# Altium footprint library EwgMicrochips.PcbLib: 61 footprints (part 2 of 4)
Each footprint in its own frame and in the unit in brackets; x right, y up, seen from the top. Pads: shape width x height; smd on the part's side, far side on the other; paste and mask are expansions set on the pad; w line width, h text height; cw(c..) or ccw(c..) is an arc to the next point about the centre after c.
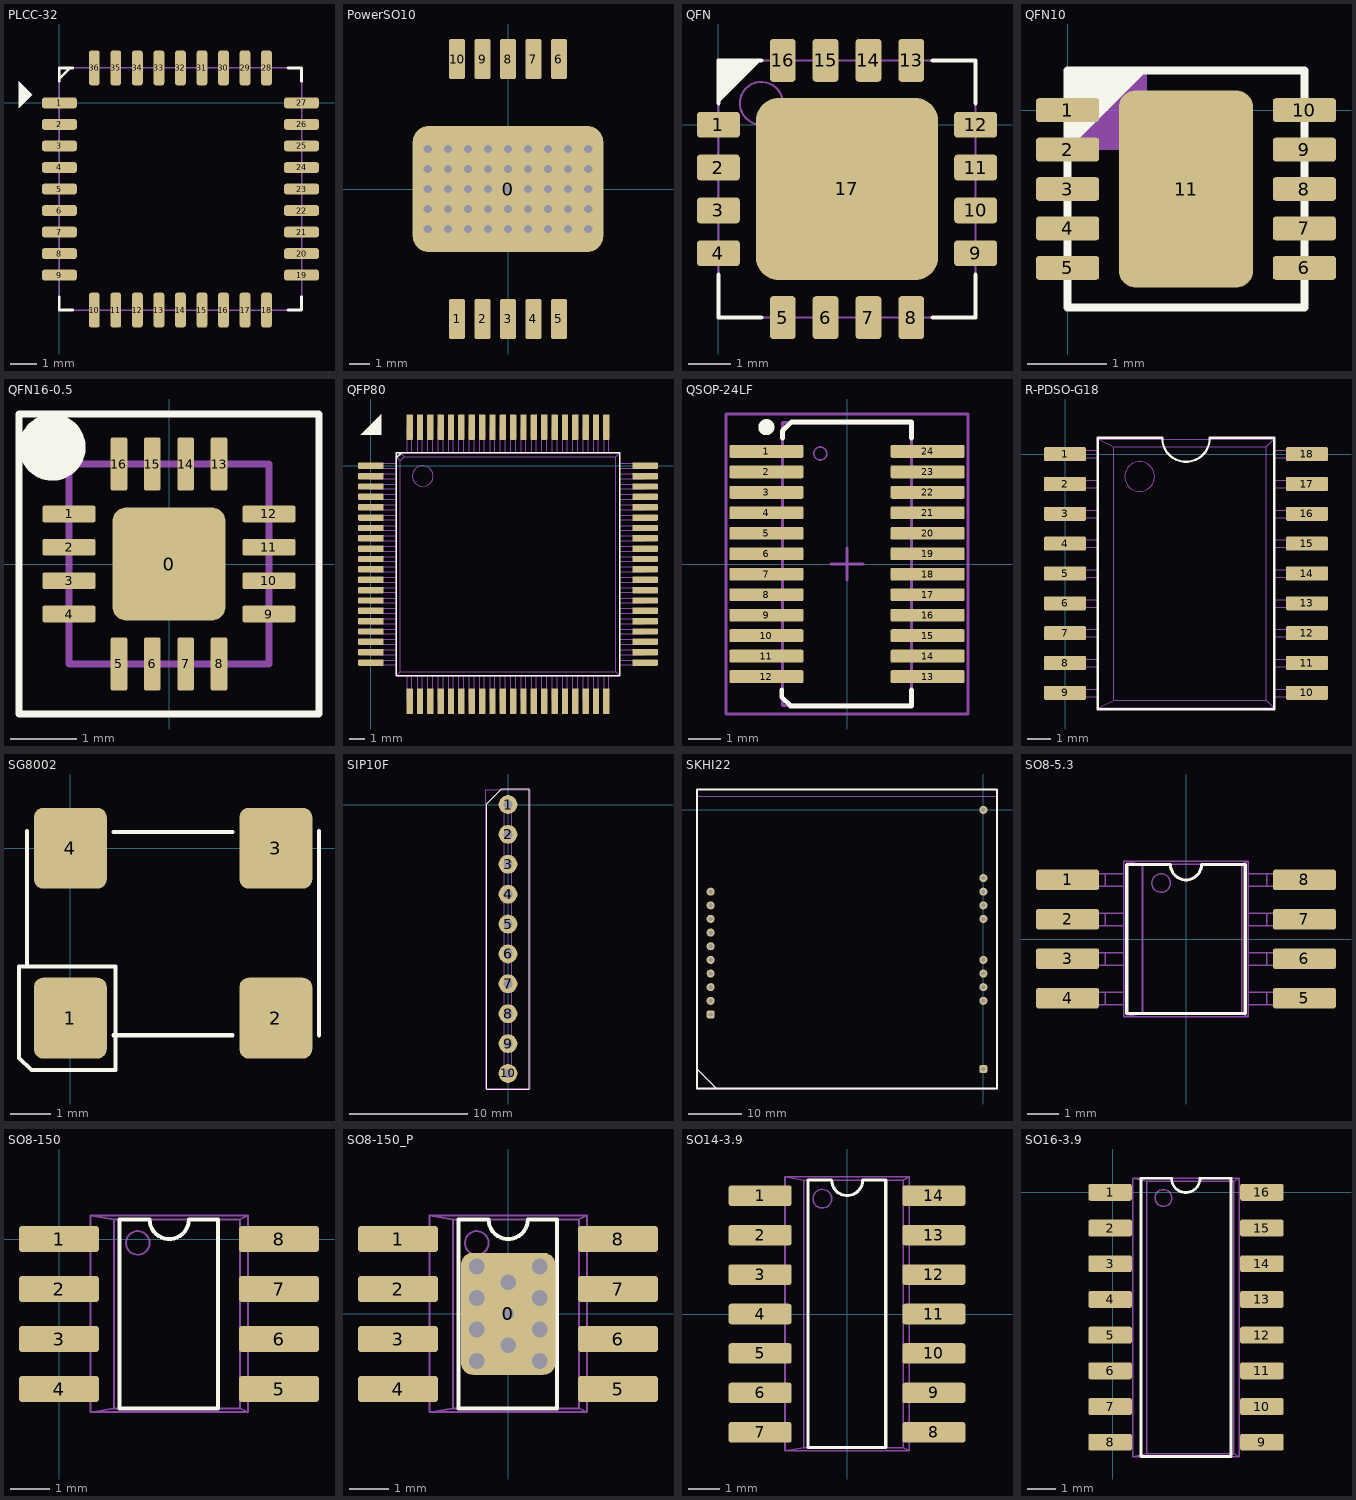
[diagram p1: the footprints below, top view; thin cyan lines are the x and y axes]

## PLCC-32 [mm]
pads (36):
  rrect50% 1.3x0.4 smd: 1(0,0) 2(0,-0.8) 3(0,-1.6) 4(0,-2.4) 5(0,-3.2) 6(0,-4) 7(0,-4.8) 8(0,-5.6) 9(0,-6.4) 19(9,-6.4) 20(9,-5.6) 21(9,-4.8) 22(9,-4) 23(9,-3.2) 24(9,-2.4) 25(9,-1.6) 26(9,-0.8) 27(9,0)
  rrect50% 0.4x1.3 smd: 10(1.3,-7.7) 11(2.1,-7.7) 12(2.9,-7.7) 13(3.7,-7.7) 14(4.5,-7.7) 15(5.3,-7.7) 16(6.1,-7.7) 17(6.9,-7.7) 18(7.7,-7.7) 28(7.7,1.3) 29(6.9,1.3) 30(6.1,1.3) 31(5.3,1.3) 32(4.5,1.3) 33(3.7,1.3) 34(2.9,1.3) 35(2.1,1.3) 36(1.3,1.3)
Top Overlay:
  region: -1.5,0.8 -1.5,-0.2 -1,0.3
  lines w0.1: 0,-7.2 0,-7.7 0.5,-7.7 ; 0,0.8 0,1.3 0.5,1.3 ; 0,0.9 0.4,1.3 ; 8.5,-7.7 9,-7.7 9,-7.2 ; 8.5,1.3 9,1.3 9,0.8
Mechanical 1:
  lines w0.05: 0,-7.7 9,-7.7 9,1.3 0,1.3 0,-7.7
  text "PLCC - 32" at 2,-4.425 h0.63
  text "HMC6343" at 2,-3.062 h0.63

## PowerSO10 [mm]
pads (11):
  rrect25% 9.5x6.3 all layers, no hole: 0(0,0)
  rrect25% 0.8x2 smd: 1(-2.54,-6.477) 2(-1.27,-6.477) 3(0,-6.477) 4(1.27,-6.477) 5(2.54,-6.477) 6(2.54,6.477) 7(1.27,6.477) 8(0,6.477) 9(-1.27,6.477) 10(-2.54,6.477)
via 4,2 diameter 0.6 hole 0.4
via 4,0 diameter 0.6 hole 0.4
via 4,1 diameter 0.6 hole 0.4
via 4,-1 diameter 0.6 hole 0.4
via 4,-2 diameter 0.6 hole 0.4
via 3,-2 diameter 0.6 hole 0.4
via 3,-1 diameter 0.6 hole 0.4
via 3,1 diameter 0.6 hole 0.4
via 3,0 diameter 0.6 hole 0.4
via 3,2 diameter 0.6 hole 0.4
via 2,-1 diameter 0.6 hole 0.4
via 2,-2 diameter 0.6 hole 0.4
via 2,0 diameter 0.6 hole 0.4
via 2,1 diameter 0.6 hole 0.4
via 2,2 diameter 0.6 hole 0.4
via 1,1 diameter 0.6 hole 0.4
via 1,2 diameter 0.6 hole 0.4
via 1,0 diameter 0.6 hole 0.4
via 1,-2 diameter 0.6 hole 0.4
via 1,-1 diameter 0.6 hole 0.4
via 0,-1 diameter 0.6 hole 0.4
via 0,-2 diameter 0.6 hole 0.4
via -1,-1 diameter 0.6 hole 0.4
via 0,1 diameter 0.6 hole 0.4
via 0,2 diameter 0.6 hole 0.4
via -1,2 diameter 0.6 hole 0.4
via -1,1 diameter 0.6 hole 0.4
via -1,0 diameter 0.6 hole 0.4
via -1,-2 diameter 0.6 hole 0.4
via -2,-2 diameter 0.6 hole 0.4
via -2,-1 diameter 0.6 hole 0.4
via -2,0 diameter 0.6 hole 0.4
via -2,1 diameter 0.6 hole 0.4
via -2,2 diameter 0.6 hole 0.4
via -3,2 diameter 0.6 hole 0.4
via -3,1 diameter 0.6 hole 0.4
via -3,0 diameter 0.6 hole 0.4
via -3,-1 diameter 0.6 hole 0.4
via -3,-2 diameter 0.6 hole 0.4
via -4,-2 diameter 0.6 hole 0.4
via -4,-1 diameter 0.6 hole 0.4
via -4,0 diameter 0.6 hole 0.4
via -4,1 diameter 0.6 hole 0.4
via -4,2 diameter 0.6 hole 0.4
via 0,0 diameter 0.6 hole 0.4
3D body: height 3.35, standoff 0, extent -4.7,-6.95 4.7,6.95

## QFN [mm]
pads (17):
  rrect25% 1x0.6 smd: 1(0,0) 2(0,-1) 3(0,-2) 4(0,-3) 9(6,-3) 10(6,-2) 11(6,-1) 12(6,0)
  rrect25% 0.6x1 smd: 5(1.5,-4.5) 6(2.5,-4.5) 7(3.5,-4.5) 8(4.5,-4.5) 13(4.5,1.5) 14(3.5,1.5) 15(2.5,1.5) 16(1.5,1.5)
  rrect25% 4.25x4.25 smd: 17(3,-1.5)
Top Overlay:
  region: 0,0.5 1,1.5 0,1.5
  lines w0.1: 0,-3.5 0,-4.5 1,-4.5 ; 0,0.5 0,1.5 1,1.5 ; 5,-4.5 6,-4.5 6,-3.5 ; 5,1.5 6,1.5 6,0.5
Mechanical 1:
  circle w0.05: c1,0.5 r0.5
  lines w0.05: 0,-4.5 0,1.5 6,1.5 6,-4.5 0,-4.5

## QFN10 [mm]
pads (11):
  rrect25% 0.8x0.3 smd: 1(0,0) 2(0,-0.5) 3(0,-1) 4(0,-1.5) 5(0,-2) 6(3,-2) 7(3,-1.5) 8(3,-1) 9(3,-0.5) 10(3,0)
  rrect25% 1.7x2.5 smd: 11(1.5,-1)
Top Overlay:
  region: 0,0.5 0,-0.5 1,0.5
  lines w0.1: 0,-2.5 3,-2.5 3,0.5 0,0.5 0,-2.5
Mechanical 1:
  region: 0,-0.5 1,-0.5 1,0.5 0,0.5
  lines w0.05: 0,-2.5 3,-2.5 3,0.5 0,0.5 0,-2.5

## QFN16-0.5 [mm]
pads (17):
  rrect25% 1.7x1.7 smd: 0(0,0)
  rrect25% 0.8x0.25 smd: 1(-1.5,0.75) 2(-1.5,0.25) 3(-1.5,-0.25) 4(-1.5,-0.75) 9(1.5,-0.75) 10(1.5,-0.25) 11(1.5,0.25) 12(1.5,0.75)
  rrect25% 0.25x0.8 smd: 5(-0.75,-1.5) 6(-0.25,-1.5) 7(0.25,-1.5) 8(0.75,-1.5) 13(0.75,1.5) 14(0.25,1.5) 15(-0.25,1.5) 16(-0.75,1.5)
Top Overlay:
  circle w0.5: c-1.75,1.75 r0.25
  lines w0.1: -2.25,-2.25 -2.25,2.25 2.25,2.25 2.25,-2.25 -2.25,-2.25
Mechanical 1:
  lines w0.1: -1.5,-1.5 -1.5,1.5 0,1.5 1.5,1.5 1.5,-1.5 -1.5,-1.5
3D body: height 0.9, standoff 0, extent -1.549,-1.521 1.493,1.521

## QFP80 [mm]
pads (80):
  rrect25% 1.6x0.4 smd: 1(0,0) 2(0,-0.65) 3(0,-1.3) 4(0,-1.95) 5(0,-2.6) 6(0,-3.25) 7(0,-3.9) 8(0,-4.55) 9(0,-5.2) 10(0,-5.85) 11(0,-6.5) 12(0,-7.15) 13(0,-7.8) 14(0,-8.45) 15(0,-9.1) 16(0,-9.75) 17(0,-10.4) 18(0,-11.05) 19(0,-11.7) 20(0,-12.35) 41(17.2,-12.35) 42(17.2,-11.7) 43(17.2,-11.05) 44(17.2,-10.4) 45(17.2,-9.75) 46(17.2,-9.1) 47(17.2,-8.45) 48(17.2,-7.8) 49(17.2,-7.15) 50(17.2,-6.5) 51(17.2,-5.85) 52(17.2,-5.2) 53(17.2,-4.55) 54(17.2,-3.9) 55(17.2,-3.25) 56(17.2,-2.6) 57(17.2,-1.95) 58(17.2,-1.3) 59(17.2,-0.65) 60(17.2,0)
  rrect25% 0.4x1.6 smd: 21(2.425,-14.775) 22(3.075,-14.775) 23(3.725,-14.775) 24(4.375,-14.775) 25(5.025,-14.775) 26(5.675,-14.775) 27(6.325,-14.775) 28(6.975,-14.775) 29(7.625,-14.775) 30(8.275,-14.775) 31(8.925,-14.775) 32(9.575,-14.775) 33(10.225,-14.775) 34(10.875,-14.775) 35(11.525,-14.775) 36(12.175,-14.775) 37(12.825,-14.775) 38(13.475,-14.775) 39(14.125,-14.775) 40(14.775,-14.775) 61(14.775,2.425) 62(14.125,2.425) 63(13.475,2.425) 64(12.825,2.425) 65(12.175,2.425) 66(11.525,2.425) 67(10.875,2.425) 68(10.225,2.425) 69(9.575,2.425) 70(8.925,2.425) 71(8.275,2.425) 72(7.625,2.425) 73(6.975,2.425) 74(6.325,2.425) 75(5.675,2.425) 76(5.025,2.425) 77(4.375,2.425) 78(3.725,2.425) 79(3.075,2.425) 80(2.425,2.425)
Top Overlay:
  region: 0.65,1.95 0.65,3.25 -0.65,1.95
  lines w0.1: 1.6,0.5 1.925,0.825 ; 1.6,-13.175 15.6,-13.175 15.6,0.825 1.6,0.825 1.6,-13.175
Mechanical 1:
  drawing of 416 lines, arcs and shapes, not listed

## QSOP-24LF [mm] "SOP, 24-Leads, Body 8.8x4.0mm (max), Pitch 0.63mm,"
height 1.75
pads (24):
  rrect25% 2.3x0.4 smd: 1(-2.5,3.492) 2(-2.5,2.857) 3(-2.5,2.222) 4(-2.5,1.587) 5(-2.5,0.953) 6(-2.5,0.318) 7(-2.5,-0.318) 8(-2.5,-0.953) 9(-2.5,-1.587) 10(-2.5,-2.222) 11(-2.5,-2.857) 12(-2.5,-3.492) 13(2.5,-3.492) 14(2.5,-2.857) 15(2.5,-2.222) 16(2.5,-1.587) 17(2.5,-0.953) 18(2.5,-0.318) 19(2.5,0.318) 20(2.5,0.953) 21(2.5,1.587) 22(2.5,2.222) 23(2.5,2.857) 24(2.5,3.492)
Top Overlay:
  circle w0.25: c-2.5,4.243 r0.125
  lines w0.15: -2.025,-3.9 -2.025,-4.125 -1.75,-4.4 2,-4.4 2,-3.9 ; -2,3.9 -2,4.125 -1.725,4.4 2,4.4 2,3.9
Mechanical 13:
  circle w0.05: c-0.827,3.425 r0.202
  lines w0.1: -2,-4.38 -2,4.38 2,4.38 2,-4.38 -2,-4.38
Mechanical 15:
  lines w0.1: -0.5,0 0.5,0 ; 0,-0.5 0,0.5 ; -3.75,-4.65 -3.75,4.65 3.75,4.65 3.75,-4.65 -3.75,-4.65
3D body: height 1.55, standoff 0, extent -3.04,-4.33 3.04,4.33

## R-PDSO-G18 [mm]
pads (18):
  rrect25% 1.8x0.6 smd: 1(0,0) 2(0,-1.27) 3(0,-2.54) 4(0,-3.81) 5(0,-5.08) 6(0,-6.35) 7(0,-7.62) 8(0,-8.89) 9(0,-10.16) 10(10.3,-10.16) 11(10.3,-8.89) 12(10.3,-7.62) 13(10.3,-6.35) 14(10.3,-5.08) 15(10.3,-3.81) 16(10.3,-2.54) 17(10.3,-1.27) 18(10.3,0)
Top Overlay:
  lines w0.1: 1.4,-10.855 1.4,0.695 4.134,0.695 ccw(c5.15,0.695) 6.166,0.695 8.9,0.695 8.9,-10.855 1.4,-10.855
Mechanical 1:
  circle w0.05: c3.175,-0.953 r0.635
  lines w0.05: 0.794,-10.319 0.794,-10.001 ; 0.794,-9.049 0.794,-8.731 ; 0.794,-7.779 0.794,-7.461 ; 0.794,-6.509 0.794,-6.191 ; 0.794,-5.239 0.794,-4.921 ; 0.794,-3.969 0.794,-3.651 ; 0.794,-2.699 0.794,-2.381 ; 0.794,-1.429 0.794,-1.111 ; 0.794,-0.159 0.794,0.159 ; 1.429,-10.319 0,-10.319 0,-10.001 1.429,-10.001 ; 1.429,-9.049 0,-9.049 0,-8.731 1.429,-8.731 ; 1.429,-7.779 0,-7.779 0,-7.461 1.429,-7.461 ; 1.429,-6.509 0,-6.509 0,-6.191 1.429,-6.191 ; 1.429,-5.239 0,-5.239 0,-4.921 1.429,-4.921 ; 1.429,-3.969 0,-3.969 0,-3.651 1.429,-3.651 ; 1.429,-2.699 0,-2.699 0,-2.381 1.429,-2.381 ; 1.429,-1.429 0,-1.429 0,-1.111 1.429,-1.111 ; 1.429,-0.159 0,-0.159 0,0.159 1.429,0.159 ; 8.89,-10.319 10.319,-10.319 10.319,-10.001 8.89,-10.001 ; 8.89,-9.049 10.319,-9.049 10.319,-8.731 8.89,-8.731 ; 8.89,-7.779 10.319,-7.779 10.319,-7.461 8.89,-7.461 ; 8.89,-6.509 10.319,-6.509 10.319,-6.191 8.89,-6.191 ; 8.89,-5.239 10.319,-5.239 10.319,-4.921 8.89,-4.921 ; 8.89,-3.969 10.319,-3.969 10.319,-3.651 8.89,-3.651 ; 8.89,-2.699 10.319,-2.699 10.319,-2.381 8.89,-2.381 ; 8.89,-1.429 10.319,-1.429 10.319,-1.111 8.89,-1.111 ; 8.89,-0.159 10.319,-0.159 10.319,0.159 8.89,0.159 ; 9.525,-10.319 9.525,-10.001 ; 9.525,-9.049 9.525,-8.731 ; 9.525,-7.779 9.525,-7.461 ; 9.525,-6.509 9.525,-6.191 ; 9.525,-5.239 9.525,-4.921 ; 9.525,-3.969 9.525,-3.651 ; 9.525,-2.699 9.525,-2.381 ; 9.525,-1.429 9.525,-1.111 ; 9.525,-0.159 9.525,0.159 ; 1.429,-10.795 2.064,-10.477 ; 1.429,-10.795 1.429,0.635 ; 1.429,-10.795 8.89,-10.795 ; 1.429,0.635 2.064,0.318 ; 1.429,0.635 8.89,0.635 ; 2.064,-10.477 2.064,0.318 ; 2.064,-10.477 8.572,-10.477 ; 2.064,0.318 8.572,0.318 ; 8.572,-10.477 8.89,-10.795 ; 8.572,-10.477 8.572,0.318 ; 8.572,0.318 8.89,0.635 ; 8.89,-10.795 8.89,0.635

## SG8002 [mm] "PROGRAMMABLE HIGH-FREQUENCY CRYSTAL OSCILLATOR"
pads (4):
  rrect25% 1.8x2 smd: 1(0,-4.2) 2(5.08,-4.2) 3(5.08,0) 4(0,0)
Top Overlay:
  lines w0.1: -1.067,0.432 -1.067,-2.921 ; 1.067,-4.623 4.013,-4.623 ; 1.067,0.406 4.013,0.406 ; 6.147,-4.623 6.147,0.432 ; -1.067,-2.921 -1.27,-2.921 -1.27,-5.182 -0.965,-5.486 1.118,-5.486 1.118,-4.242 1.118,-2.921 -1.067,-2.921
3D body: height 1, standoff 0, extent -1.11,-4.508 6.19,0.292

## SIP10F [mm]
pads (10):
  round 1.6 hole 0.8: 1(0,0) 2(0,-2.54) 3(0,-5.08) 4(0,-7.62) 5(0,-10.16) 6(0,-12.7) 7(0,-15.24) 8(0,-17.78) 9(0,-20.32) 10(0,-22.86)
Top Overlay:
  lines w0.1: -1.8,-24.18 -1.8,0.05 -0.53,1.32 1.8,1.32 1.8,-24.18 -1.8,-24.18
Mechanical 1:
  lines w0.05: -1.905,-24.13 -1.905,1.27 1.905,1.27 1.905,-24.13 -1.905,-24.13 ; -0.318,-23.495 -0.318,0.635 0.318,0.635 0.318,-23.495 -0.318,-23.495

## SKHI22 [mm] "IGBT DRIVER"
height 16
pads (20):
  rrect50% 1.5x1.5 hole 0.8: P5(-50.8,-38.1) S1(0,-48.26)
  round 1.5 hole 0.8: P6(-50.8,-35.56) P7(-50.8,-33.02) P8(-50.8,-30.48) P9(-50.8,-27.94) P10(-50.8,-25.4) P11(-50.8,-22.86) P12(-50.8,-20.32) P13(-50.8,-17.78) P14(-50.8,-15.24) S6(0,-35.56) S7(0,-33.02) S8(0,-30.48) S9(0,-27.94) S12(0,-20.32) S13(0,-17.78) S14(0,-15.24) S15(0,-12.7) S20(0,0)
Top Overlay:
  lines w0.15: -53.34,-48.26 -49.75,-51.85
  lines w0.3: -53.34,-51.9 2.54,-51.9 2.54,3.8 -53.34,3.8 -53.34,-51.9
Mechanical 1:
  lines w0.1: -53.34,-48.26 -49.7,-51.9 ; -53.34,-51.9 2.54,-51.9 2.54,2.54 -53.34,2.54 -53.34,-51.9
3D body: height 16.01, standoff -3.5, extent -52.8,-51.6 2.2,3.4

## SO8-5.3 [mil]
pads (8):
  rrect25% 80x26 smd: 1(-150,75) 2(-150,25) 3(-150,-25) 4(-150,-75) 5(150,-75) 6(150,-25) 7(150,25) 8(150,75)
Top Overlay:
  lines w3.94: -75,-94.49 75,-94.49 75,94.49 37.4,94.49 19.69,94.49 cw(c0,94.49) -19.68,94.49 -38.19,94.49 -75,94.49 -75,-94.49
Mechanical 1:
  circle w1.97: c-31.5,70.87 r11.81
  lines w1.97: -102.36,-83.07 -102.36,-67.32 ; -102.36,-33.07 -102.36,-17.32 ; -102.36,16.93 -102.36,32.68 ; -102.36,66.93 -102.36,82.68 ; -78.74,-83.07 -125.98,-83.07 -125.98,-67.32 -78.74,-67.32 ; -78.74,-33.07 -125.98,-33.07 -125.98,-17.32 -78.74,-17.32 ; -78.74,16.93 -125.98,16.93 -125.98,32.68 -78.74,32.68 ; -78.74,66.93 -125.98,66.93 -125.98,82.68 -78.74,82.68 ; 78.74,-83.07 125.98,-83.07 125.98,-67.32 78.74,-67.32 ; 78.74,-33.07 125.98,-33.07 125.98,-17.32 78.74,-17.32 ; 78.74,16.93 125.98,16.93 125.98,32.68 78.74,32.68 ; 78.74,66.93 125.98,66.93 125.98,82.68 78.74,82.68 ; 102.36,-83.07 102.36,-67.32 ; 102.36,-33.07 102.36,-17.32 ; 102.36,16.93 102.36,32.68 ; 102.36,66.93 102.36,82.68 ; -78.74,-98.43 -55.12,-94.49 ; -78.74,-98.43 -78.74,98.43 ; -78.74,-98.43 78.74,-98.43 ; -78.74,98.43 -55.12,94.49 ; -78.74,98.43 78.74,98.43 ; -55.12,-94.49 -55.12,94.49 ; -55.12,-94.49 70.87,-94.49 ; -55.12,94.49 70.87,94.49 ; 70.87,-94.49 78.74,-98.43 ; 70.87,-94.49 70.87,94.49 ; 70.87,94.49 78.74,98.43 ; 78.74,-98.43 78.74,98.43
3D body: height 76.77, standoff 0, extent -155.5,-104.33 155.52,104.33

## SO8-150 [mil]
pads (8):
  rrect25% 80x26 smd: 1(0,0) 2(0,-50) 3(0,-100) 4(0,-150) 5(220,-150) 6(220,-100) 7(220,-50) 8(220,0)
Top Overlay:
  lines w3.94: 60.63,-169.29 159.06,-169.29 159.06,19.68 147.64,19.68 129.92,19.68 cw(c110.24,19.68) 90.55,19.69 72.05,19.68 60.63,19.68 60.63,-169.29
Mechanical 1:
  circle w1.97: c78.74,-3.94 r11.81
  lines w1.97: 7.87,-157.87 7.87,-142.13 ; 7.87,-107.87 7.87,-92.13 ; 7.87,-57.87 7.87,-42.13 ; 7.87,-7.87 7.87,7.87 ; 31.5,-157.87 -15.75,-157.87 -15.75,-142.13 31.5,-142.13 ; 31.5,-107.87 -15.75,-107.87 -15.75,-92.13 31.5,-92.13 ; 31.5,-57.87 -15.75,-57.87 -15.75,-42.13 31.5,-42.13 ; 31.5,-7.87 -15.75,-7.87 -15.75,7.87 31.5,7.87 ; 188.98,-157.87 236.22,-157.87 236.22,-142.13 188.98,-142.13 ; 188.98,-107.87 236.22,-107.87 236.22,-92.13 188.98,-92.13 ; 188.98,-57.87 236.22,-57.87 236.22,-42.13 188.98,-42.13 ; 188.98,-7.87 236.22,-7.87 236.22,7.87 188.98,7.87 ; 212.6,-157.87 212.6,-142.13 ; 212.6,-107.87 212.6,-92.13 ; 212.6,-57.87 212.6,-42.13 ; 212.6,-7.87 212.6,7.87 ; 31.5,-173.23 55.12,-169.29 ; 31.5,-173.23 31.5,23.62 ; 31.5,-173.23 188.98,-173.23 ; 31.5,23.62 55.12,19.68 ; 31.5,23.62 188.98,23.62 ; 55.12,-169.29 55.12,19.68 ; 55.12,-169.29 181.1,-169.29 ; 55.12,19.68 181.1,19.68 ; 181.1,-169.29 188.98,-173.23 ; 181.1,-169.29 181.1,19.68 ; 181.1,19.68 188.98,23.62 ; 188.98,-173.23 188.98,23.62
3D body: height 68.9, standoff 0.01, extent -8.09,-173.23 228.58,23.62

## SO8-150_P [mil]
pads (9):
  rrect25% 94.49x122.05 hole 11.81: 0(0,0)
  rrect25% 80x26 smd: 1(-110.24,74.8) 2(-110.24,24.8) 3(-110.24,-25.2) 4(-110.24,-75.2) 5(109.76,-75.2) 6(109.76,-25.2) 7(109.76,24.8) 8(109.76,74.8)
via -31.5,-15.75 diameter 27.56 hole 15.75
via 31.5,-15.75 diameter 27.56 hole 15.75
via -31.5,47.24 diameter 27.56 hole 15.75
via 31.5,47.24 diameter 27.56 hole 15.75
via 0,31.5 diameter 27.56 hole 15.75
via -31.5,15.75 diameter 27.56 hole 15.75
via 31.5,15.75 diameter 27.56 hole 15.75
via -31.5,-47.24 diameter 27.56 hole 15.75
via 31.5,-47.24 diameter 27.56 hole 15.75
via 0,-31.5 diameter 27.56 hole 15.75
Top Overlay:
  lines w3.94: -49.61,-94.49 48.82,-94.49 48.82,94.49 37.4,94.49 19.69,94.49 cw(c0,94.49) -19.68,94.49 -38.19,94.49 -49.61,94.49 -49.61,-94.49
Mechanical 1:
  circle w1.97: c-31.5,70.87 r11.81
  lines w1.97: -102.36,-83.07 -102.36,-67.32 ; -102.36,-33.07 -102.36,-17.32 ; -102.36,16.93 -102.36,32.68 ; -102.36,66.93 -102.36,82.68 ; -78.74,-83.07 -125.98,-83.07 -125.98,-67.32 -78.74,-67.32 ; -78.74,-33.07 -125.98,-33.07 -125.98,-17.32 -78.74,-17.32 ; -78.74,16.93 -125.98,16.93 -125.98,32.68 -78.74,32.68 ; -78.74,66.93 -125.98,66.93 -125.98,82.68 -78.74,82.68 ; 78.74,-83.07 125.98,-83.07 125.98,-67.32 78.74,-67.32 ; 78.74,-33.07 125.98,-33.07 125.98,-17.32 78.74,-17.32 ; 78.74,16.93 125.98,16.93 125.98,32.68 78.74,32.68 ; 78.74,66.93 125.98,66.93 125.98,82.68 78.74,82.68 ; 102.36,-83.07 102.36,-67.32 ; 102.36,-33.07 102.36,-17.32 ; 102.36,16.93 102.36,32.68 ; 102.36,66.93 102.36,82.68 ; -78.74,-98.43 -55.12,-94.49 ; -78.74,-98.43 -78.74,98.43 ; -78.74,-98.43 78.74,-98.43 ; -78.74,98.43 -55.12,94.49 ; -78.74,98.43 78.74,98.43 ; -55.12,-94.49 -55.12,94.49 ; -55.12,-94.49 70.87,-94.49 ; -55.12,94.49 70.87,94.49 ; 70.87,-94.49 78.74,-98.43 ; 70.87,-94.49 70.87,94.49 ; 70.87,94.49 78.74,98.43 ; 78.74,-98.43 78.74,98.43
3D body: height 68.9, standoff 0.01, extent -118.33,-98.43 118.34,98.43

## SO14-3.9 [mil]
pads (14):
  rrect25% 80x26 smd: 1(-110,150) 2(-110,100) 3(-110,50) 4(-110,0) 5(-110,-50) 6(-110,-100) 7(-110,-150) 8(110,-150) 9(110,-100) 10(110,-50) 11(110,0) 12(110,50) 13(110,100) 14(110,150)
Top Overlay:
  lines w3.94: -49.37,-169.29 49.06,-169.29 49.06,169.69 37.64,169.69 19.92,169.69 cw(c0.24,169.69) -19.45,169.69 -37.95,169.69 -49.37,169.69 -49.37,-169.29
Mechanical 1:
  circle w1.97: c-31.26,146.06 r11.81
  lines w1.97: -102.13,-157.87 -102.13,-142.13 ; -102.13,-107.87 -102.13,-92.13 ; -102.13,-57.87 -102.13,-42.13 ; -102.13,-7.87 -102.13,7.87 ; -102.13,42.13 -102.13,57.87 ; -102.13,92.13 -102.13,107.87 ; -102.13,142.13 -102.13,157.87 ; -78.5,-157.87 -125.75,-157.87 -125.75,-142.13 -78.5,-142.13 ; -78.5,-107.87 -125.75,-107.87 -125.75,-92.13 -78.5,-92.13 ; -78.5,-57.87 -125.75,-57.87 -125.75,-42.13 -78.5,-42.13 ; -78.5,-7.87 -125.75,-7.87 -125.75,7.87 -78.5,7.87 ; -78.5,42.13 -125.75,42.13 -125.75,57.87 -78.5,57.87 ; -78.5,92.13 -125.75,92.13 -125.75,107.87 -78.5,107.87 ; -78.5,142.13 -125.75,142.13 -125.75,157.87 -78.5,157.87 ; 78.98,-157.87 126.22,-157.87 126.22,-142.13 78.98,-142.13 ; 78.98,-107.87 126.22,-107.87 126.22,-92.13 78.98,-92.13 ; 78.98,-57.87 126.22,-57.87 126.22,-42.13 78.98,-42.13 ; 78.98,-7.87 126.22,-7.87 126.22,7.87 78.98,7.87 ; 78.98,42.13 126.22,42.13 126.22,57.87 78.98,57.87 ; 78.98,92.13 126.22,92.13 126.22,107.87 78.98,107.87 ; 78.98,142.13 126.22,142.13 126.22,157.87 78.98,157.87 ; 102.6,-157.87 102.6,-142.13 ; 102.6,-107.87 102.6,-92.13 ; 102.6,-57.87 102.6,-42.13 ; 102.6,-7.87 102.6,7.87 ; 102.6,42.13 102.6,57.87 ; 102.6,92.13 102.6,107.87 ; 102.6,142.13 102.6,157.87 ; -78.5,-173.23 -78.5,173.62 ; -78.5,-173.23 78.98,-173.23 ; -78.5,-173.23 -54.88,-169.29 ; -78.5,173.62 78.98,173.62 ; -78.5,173.62 -54.88,169.69 ; -54.88,-169.29 71.1,-169.29 ; -54.88,-169.29 -54.88,169.69 ; -54.88,169.69 71.1,169.69 ; 71.1,-169.29 78.98,-173.23 ; 71.1,-169.29 71.1,169.69 ; 71.1,169.69 78.98,173.62 ; 78.98,-173.23 78.98,173.62
3D body: height 68.9, standoff 0, extent -114.17,-168.31 114.18,168.31

## SO16-3.9 [mm]
pads (16):
  rrect25% 1.55x0.6 smd: 1(-0.1,0) 2(-0.1,-1.27) 3(-0.1,-2.54) 4(-0.1,-3.81) 5(-0.1,-5.08) 6(-0.1,-6.35) 7(-0.1,-7.62) 8(-0.1,-8.89) 9(5.3,-8.89) 10(5.3,-7.62) 11(5.3,-6.35) 12(5.3,-5.08) 13(5.3,-3.81) 14(5.3,-2.54) 15(5.3,-1.27) 16(5.3,0)
Top Overlay:
  lines w0.1: 1,-9.4 1,0.5 1.837,0.5 2.084,0.5 ccw(c2.592,0.5) 3.1,0.5 3.363,0.5 4.2,0.5 4.2,-9.4 1,-9.4
Mechanical 1:
  circle w0.05: c1.8,-0.2 r0.3
  lines w0.05: 0.1,-9.09 0.1,-8.69 ; 0.1,-7.82 0.1,-7.42 ; 0.1,-6.55 0.1,-6.15 ; 0.1,-5.28 0.1,-4.88 ; 0.1,-4.01 0.1,-3.61 ; 0.1,-2.74 0.1,-2.34 ; 0.1,-1.47 0.1,-1.07 ; 0.1,-0.2 0.1,0.2 ; 0.7,-9.09 -0.4,-9.09 -0.4,-8.69 0.7,-8.69 ; 0.7,-7.82 -0.4,-7.82 -0.4,-7.42 0.7,-7.42 ; 0.7,-6.55 -0.4,-6.55 -0.4,-6.15 0.7,-6.15 ; 0.7,-5.28 -0.4,-5.28 -0.4,-4.88 0.7,-4.88 ; 0.7,-4.01 -0.4,-4.01 -0.4,-3.61 0.7,-3.61 ; 0.7,-2.74 -0.4,-2.74 -0.4,-2.34 0.7,-2.34 ; 0.7,-1.47 -0.4,-1.47 -0.4,-1.07 0.7,-1.07 ; 0.7,-0.2 -0.4,-0.2 -0.4,0.2 0.7,0.2 ; 4.5,-9.09 5.6,-9.09 5.6,-8.69 4.5,-8.69 ; 4.5,-7.82 5.6,-7.82 5.6,-7.42 4.5,-7.42 ; 4.5,-6.55 5.6,-6.55 5.6,-6.15 4.5,-6.15 ; 4.5,-5.28 5.6,-5.28 5.6,-4.88 4.5,-4.88 ; 4.5,-4.01 5.6,-4.01 5.6,-3.61 4.5,-3.61 ; 4.5,-2.74 5.6,-2.74 5.6,-2.34 4.5,-2.34 ; 4.5,-1.47 5.6,-1.47 5.6,-1.07 4.5,-1.07 ; 4.5,-0.2 5.6,-0.2 5.6,0.2 4.5,0.2 ; 5.1,-9.09 5.1,-8.69 ; 5.1,-7.82 5.1,-7.42 ; 5.1,-6.55 5.1,-6.15 ; 5.1,-5.28 5.1,-4.88 ; 5.1,-4.01 5.1,-3.61 ; 5.1,-2.74 5.1,-2.34 ; 5.1,-1.47 5.1,-1.07 ; 5.1,-0.2 5.1,0.2 ; 0.7,-9.4 1.2,-9.3 ; 0.7,-9.4 0.7,0.5 ; 0.7,-9.4 4.5,-9.4 ; 0.7,0.5 1.2,0.4 ; 0.7,0.5 4.5,0.5 ; 1.2,-9.3 1.2,0.4 ; 1.2,-9.3 4.3,-9.3 ; 1.2,0.4 4.3,0.4 ; 4.3,-9.3 4.5,-9.4 ; 4.3,-9.3 4.3,0.4 ; 4.3,0.4 4.5,0.5 ; 4.5,-9.4 4.5,0.5
3D body: height 1.7, standoff -0.05, extent -0.525,-9.45 5.675,0.55